# Altium integrated library OneBox.IntLib: 172 symbols (part 1 of 2) (continued)
## FUSB302BMPX (continued)

## FUSB340TMX
designator U?
Integrated Circuit; Manufacturer_Name: onsemi; Datasheet Link: https://componentsearchengine.com//FUSB340TMX.pdf; Height: 0.4mm; Mouser2 Part Number: 512-FUSB340TMX; Mouser2 Price/Stock: https://www.mouser.com/Search/Refine.aspx?Keyword=512-FUSB340TMX; Manufacturer_Part_Number: FUSB340TMX
footprint X2QFN-18
pins: 1 SSTXCOM-, 2 SSTXCOM+, 3 GND_1, 4 SSRXCOM-, 5 SSRXCOM+, 6 S, 7 ~{OE}, 8 SSRX2+, 9 SSRX2-, 10 SSRX1+, 11 SSRX1-, 12 GND_2, 13 SSTX2+, 14 SSTX2-, 15 SSTX1+, 16 SSTX1-, 17 VDD, 18 GND_3, 19 EP

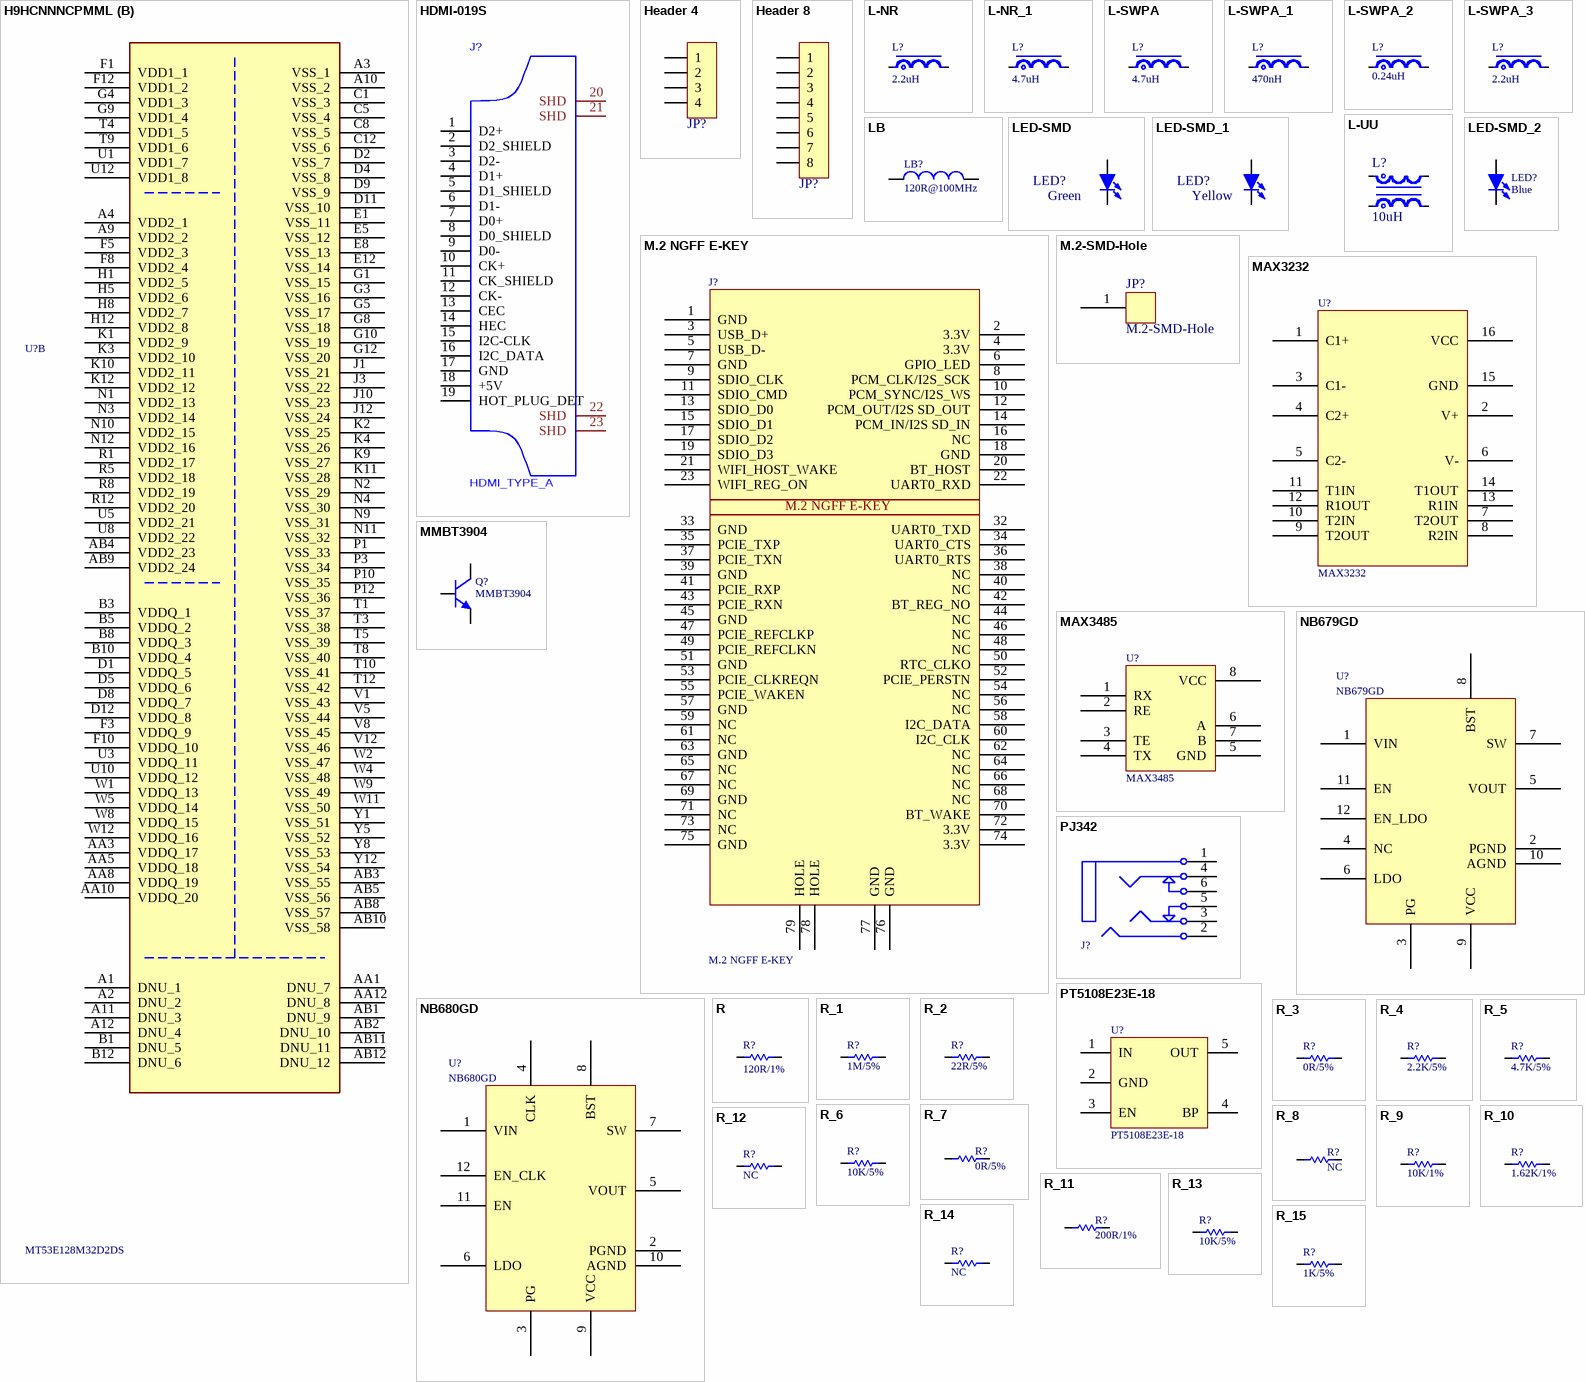
[diagram p2: symbols H9HCNNNCPMML to R_15]

## H9HCNNNCPMML
designator U?, comment MT53E128M32D2DS
LPDDR4 32Gbit 2GX16
footprint FBGA200_L15W10 (- Power By MH-KuBao!)
part A pins: A5 ZQ0, A8 ZQ1, AA2 DQ0_b, AA4 DQ7_b, AA9 DQ15_b, AA11 DQ8_b, B2 DQ0_a, B4 DQ7_a, B9 DQ15_a, B11 DQ8_a, C2 DQl_a, C3 DMI0_a, C4 DQ6_a, C9 DQ14_a, C10 DMIl_a, C11 DQ9_a, D3 DQS0_t_a, D10 DQS1_t_a, E2 DQ2_a, E3 DQS0_c_a, E4 DQ5_a, E9 DQ13_a, E10 DQS1_c_a, E11 DQ10_a, F2 DQ3_a, F4 DQ4_a, F9 DQ12_a, F11 DQ1l_a, G2 ODT_CA_a, G11 ZQ2_NC, H2 CA0_a, H3 CSl_a, H4 CS0_a, H9 CA2_a, H10 CA3_a, H11 CA4_a, J2 CAl_a, J4 CKE0_a, J5 CKEl_a, J8 CK_t_a, J9 CK_c_a, J11 CA5_a, K5 CS2_a_NC, K8 CKE2_a_NC, N5 CS2_b_NC, N8 CKE2_b_NC, P2 CA1_b, P4 CKE0_b, P5 CKE1_b, P8 CK_t_b, P9 CK_c_b, P11 CA5_b, R2 CA0_b, R3 CS1_b, R4 CS0_b, R9 CA2_b, R10 CA3_b, R11 CA4_b, T2 ODT_CA_b, T11 RESET_n, U2 DQ3_b, U4 DQ4_b, U9 DQ12_b, U11 DQ11_b, V2 DQ2_b, V3 DOS0_c_b, V4 DQ5_b, V9 DQ13_b, V10 DOSl_c_b, V11 DQ10_b, W3 DOS0_t_b, W10 DQS1_t_p, Y2 DQ1_b, Y3 DMI0_b, Y4 DQ6_b, Y9 DQ14_b, Y10 DMI1_b, Y11 DQ9_b
part B pins: A1 DNU_1, A2 DNU_2, A3 VSS_1, A4 VDD2_1, A9 VDD2_2, A10 VSS_2, A11 DNU_3, A12 DNU_4, AA1 DNU_7, AA3 VDDQ_17, AA5 VDDQ_18, AA8 VDDQ_19, AA10 VDDQ_20, AA12 DNU_8, AB1 DNU_9, AB2 DNU_10, AB3 VSS_55, AB4 VDD2_23, AB5 VSS_56, AB8 VSS_57, AB9 VDD2_24, AB10 VSS_58, AB11 DNU_11, AB12 DNU_12, B1 DNU_5, B3 VDDQ_1, B5 VDDQ_2, B8 VDDQ_3, B10 VDDQ_4, B12 DNU_6, C1 VSS_3, C5 VSS_4, C8 VSS_5, C12 VSS_6, D1 VDDQ_5, D2 VSS_7, D4 VSS_8, D5 VDDQ_6, D8 VDDQ_7, D9 VSS_9, D11 VSS_10, D12 VDDQ_8, E1 VSS_11, E5 VSS_12, E8 VSS_13, E12 VSS_14, F1 VDD1_1, F3 VDDQ_9, F5 VDD2_3, F8 VDD2_4, F10 VDDQ_10, F12 VDD1_2, G1 VSS_15, G3 VSS_16, G4 VDD1_3, G5 VSS_17, G8 VSS_18, G9 VDD1_4, G10 VSS_19, G12 VSS_20, H1 VDD2_5, H5 VDD2_6, H8 VDD2_7, H12 VDD2_8, J1 VSS_21, J3 VSS_22, J10 VSS_23, J12 VSS_24, K1 VDD2_9, K2 VSS_25, K3 VDD2_10, K4 VSS_26, K9 VSS_27, K10 VDD2_11, K11 VSS_28, K12 VDD2_12, N1 VDD2_13, N2 VSS_29, N3 VDD2_14, N4 VSS_30, N9 VSS_31, N10 VDD2_15, N11 VSS_32, N12 VDD2_16, P1 VSS_33, P3 VSS_34, P10 VSS_35, P12 VSS_36, R1 VDD2_17, R5 VDD2_18, R8 VDD2_19, R12 VDD2_20, T1 VSS_37, T3 VSS_38, T4 VDD1_5, T5 VSS_39, T8 VSS_40, T9 VDD1_6, T10 VSS_41, T12 VSS_42, U1 VDD1_7, U3 VDDQ_11, U5 VDD2_21, U8 VDD2_22, U10 VDDQ_12, U12 VDD1_8, V1 VSS_43, V5 VSS_44, V8 VSS_45, V12 VSS_46, W1 VDDQ_13, W2 VSS_47, W4 VSS_48, W5 VDDQ_14, W8 VDDQ_15, W9 VSS_49, W11 VSS_50, W12 VDDQ_16, Y1 VSS_51, Y5 VSS_52, Y8 VSS_53, Y12 VSS_54
part A text: CH_A; CH_B

## HDMI-019S
designator J?, comment HDMI_TYPE_A
footprint HDMI
pins: 1 D2+, 2 D2_SHIELD, 3 D2-, 4 D1+, 5 D1_SHIELD, 6 D1-, 7 D0+, 8 D0_SHIELD, 9 D0-, 10 CK+, 11 CK_SHIELD, 12 CK-, 13 CEC, 14 HEC, 15 I2C-CLK, 16 I2C_DATA, 17 GND, 18 +5V, 19 HOT_PLUG_DET, 20 SHD, 21 SHD, 22 SHD, 23 SHD

## Header 4
designator JP?, comment HDR-1X4  (value not drawn)
4P接插件; 版权归属: 源创客; BOM名称: 4P接插件; 学习资源: www.ooocke.com
footprint MX 1.25-LI-4P (长：6.75mm，宽：3.2mm，高：4.2mm)
footprint MX 1.25-LS-4P (长：9.75m，宽：3.7mm，高：4.7mm)
pins: 1, 2, 3, 4

## Header 8
designator JP?, comment HDR-1X8  (value not drawn)
8P接插件; 版权归属: 源创客; BOM名称: 8P接插件; 学习资源: www.ooocke.com
footprint MX 1.25-LS-8P (长：14.75m，宽：3.7mm，高：4.7mm)
pins: 1, 2, 3, 4, 5, 6, 7, 8

## L-NR
designator L?, comment 2.2uH
MPIA252012-2R2M 3A; BOM名称: NR磁胶电感
footprint NR2520 (2.5mm*2.0mm*1.0mm(长*宽*高）)
pins: 1, 2

## L-NR_1
designator L?, comment 4.7uH
4.7uH/3A,高2.0mm，WPN4020H4R7MT; BOM名称: NR磁胶电感
footprint NR2520 (2.5mm*2.0mm*1.0mm(长*宽*高）)
footprint NR4020 (4.0mm*4.0mm*2.0mm(长*宽*高）)
pins: 1, 2

## L-SWPA
designator L?, comment 4.7uH
电感-顺络_SWPA贴片屏蔽电感; BOM名称: 功率屏蔽电感
footprint SWPA252010 (轮廓2.5mm*2mm ，焊盘间距0.8mm)
footprint SWPA3015 (轮廓3mm*3mm ，焊盘间距1.5mm)
pins: 1, 2

## L-SWPA_1
designator L?, comment 470nH
DCR<50mohm 252010; BOM名称: 功率屏蔽电感
footprint SWPA252010 (轮廓2.5mm*2mm ，焊盘间距0.8mm)
pins: 1, 2

## L-SWPA_2
designator L?, comment 0.24uH
0.24uH/4A/WPN252012HR24MT; BOM名称: 功率屏蔽电感
footprint SWPA252010 (轮廓2.5mm*2mm ，焊盘间距0.8mm)
pins: 1, 2

## L-SWPA_3
designator L?, comment 2.2uH
电感-顺络_SWPA贴片屏蔽电感; BOM名称: 功率屏蔽电感
footprint SWPA252010 (轮廓2.5mm*2mm ，焊盘间距0.8mm)
footprint SWPA3015 (轮廓3mm*3mm ，焊盘间距1.5mm)
pins: 1, 2

## L-UU
designator L?, comment 10uH
电感-共模电感; BOM名称: 共模电感
footprint RP2_0405
footprint SDMM0806
pins: 1, 2, 3, 4

## LB
designator LB?, comment 120R@100MHz
磁珠 2A L0402; 版权归属: 源创客; BOM名称: 磁珠; 学习资源: www.ooocke.com
footprint FB 0402_L (小功率贴片磁珠)
footprint FB 0603_L (小功率贴片磁珠)
footprint FB 0805_L (小功率贴片磁珠)
footprint FB 1206_L (小功率贴片磁珠)
pins: 1, 2

## LED-SMD
designator LED?, comment Green
贴片LED; 版权归属: 源创客; BOM名称: 贴片LED; 学习资源: www.ooocke.com
footprint LED 0603B (蓝色0603LED)
footprint LED 0603G (绿色0603LED)
footprint LED 0603R (红色0603LED)
footprint LED 0603W (白色0603LED)
footprint LED 0603Y (黄色0603LED)
pins: 1 A, 2 K

## LED-SMD_1
designator LED?, comment Yellow
贴片LED; 版权归属: 源创客; BOM名称: 贴片LED; 学习资源: www.ooocke.com
footprint LED 0603B (蓝色0603LED)
footprint LED 0603G (绿色0603LED)
footprint LED 0603R (红色0603LED)
footprint LED 0603W (白色0603LED)
footprint LED 0603Y (黄色0603LED)
pins: 1 A, 2 K

## LED-SMD_2
designator LED?, comment Blue
贴片LED; 版权归属: 源创客; BOM名称: 贴片LED; 学习资源: www.ooocke.com
footprint LED 0603B (蓝色0603LED)
footprint LED 0603G (绿色0603LED)
footprint LED 0603R (红色0603LED)
footprint LED 0603W (白色0603LED)
footprint LED 0603Y (黄色0603LED)
pins: 1 A, 2 K

## M.2 NGFF E-KEY
designator J?
Connector; Manufacturer_Name: TE Connectivity; Manufacturer_Part_Number: 2199230-4; Datasheet Link: https://componentsearchengine.com//2199230-4.pdf; Mouser2 Part Number: 571-2199230-4; Mouser2 Price/Stock: https://www.mouser.com/Search/Refine.aspx?Keyword=571-2199230-4
footprint M.2 NGFF E-KEY
pins: 1 GND, 2 3.3V, 3 USB_D+, 4 3.3V, 5 USB_D-, 6 GPIO_LED, 7 GND, 8 PCM_CLK/I2S_SCK, 9 SDIO_CLK, 10 PCM_SYNC/I2S_WS, 11 SDIO_CMD, 12 PCM_OUT/I2S SD_OUT, 13 SDIO_D0, 14 PCM_IN/I2S SD_IN, 15 SDIO_D1, 16 NC, 17 SDIO_D2, 18 GND, 19 SDIO_D3, 20 BT_HOST, 21 WIFI_HOST_WAKE, 22 UART0_RXD, 23 WIFI_REG_ON, 32 UART0_TXD, 33 GND, 34 UART0_CTS, 35 PCIE_TXP, 36 UART0_RTS, 37 PCIE_TXN, 38 NC, 39 GND, 40 NC, 41 PCIE_RXP, 42 BT_REG_NO, 43 PCIE_RXN, 44 NC, 45 GND, 46 NC, 47 PCIE_REFCLKP, 48 NC, 49 PCIE_REFCLKN, 50 RTC_CLKO, 51 GND, 52 PCIE_PERSTN, 53 PCIE_CLKREQN, 54 NC, 55 PCIE_WAKEN, 56 NC, 57 GND, 58 I2C_DATA, 59 NC, 60 I2C_CLK, 61 NC, 62 NC, 63 GND, 64 NC, 65 NC, 66 NC, 67 NC, 68 NC, 69 GND, 70 BT_WAKE, 71 NC, 72 3.3V, 73 NC, 74 3.3V, 75 GND, 76 GND, 77 GND, 78 HOLE, 79 HOLE

## M.2-SMD-Hole
designator JP?
footprint M.2 SMT HOLE
footprint SMT-HOLE-M2*3.5*3.5+1.2
pins: 1

## MAX3232
designator U?
footprint SOP16_L (10.3*6.2*1.8mm（长宽高）)
pins: 1 C1+, 2 V+, 3 C1-, 4 C2+, 5 C2-, 6 V-, 7 T2OUT, 8 R2IN, 9 T2OUT, 10 T2IN, 11 T1IN, 12 R1OUT, 13 R1IN, 14 T1OUT, 15 GND, 16 VCC

## MAX3485
designator U?
footprint SOP8_L (4*5*1.8mm（长宽高）)
pins: 1 RX, 2 RE, 3 TE, 4 TX, 5 GND, 6 A, 7 B, 8 VCC

## MMBT3904
designator Q?
高频放大-NPN型; 参数: 40V 0.2A 0.3W 300MHZ; BOM名称: 高频放大-NPN型
footprint SOT723
pins: 1 B, 2 E, 3 C

## NB679GD
designator U?
footprint QFN-12 (2mm * 3mm)
pins: 1 VIN, 2 PGND, 3 PG, 4 NC, 5 VOUT, 6 LDO, 7 SW, 8 BST, 9 VCC, 10 AGND, 11 EN, 12 EN_LDO

## NB680GD
designator U?
footprint QFN-12 (2mm * 3mm)
pins: 1 VIN, 2 PGND, 3 PG, 4 CLK, 5 VOUT, 6 LDO, 7 SW, 8 BST, 9 VCC, 10 AGND, 11 EN, 12 EN_CLK

## PJ342
designator J?  (value not drawn)
3.5耳机插座,4Pin; BOM名称: 耳机插座; 版权归属: 源创客; 学习资源: www.ooocke.com
footprint PJ342A (有头)
pins: 1, 2, 3, 4, 5, 6

## PT5108E23E-18
designator U?
LDO 降压芯片; BOM名称: 可调升压芯片; 版权归属: 源创客; 学习资源: www.ooocke.com
footprint SOT23-5M (3x1.6x1.1mm(长宽高))
footprint SOT23-5N (3x1.6x1.1mm(长宽高))
pins: 1 IN, 2 GND, 3 EN, 4 BP, 5 OUT

## R
designator R?, comment 120R/1%
1% R0201; BOM名称: 贴片电阻
footprint R0201_M (1/20W贴片电阻)
footprint R0201_NS (1/20W贴片电阻-无丝印)
footprint R0402_M (1/16W贴片电阻)
footprint R0402_NS (1/16W贴片电阻-无丝印)
footprint R0603_M (1/10W贴片电阻)
footprint R0603_NS (1/10W贴片电阻-无丝印)
footprint R0805_NS (1/8W贴片电阻-无丝印)
footprint R0805_M (1/8W贴片电阻)
footprint R01005_NS (1/32W贴片电阻-无丝印)
footprint R1206_M (1/4W贴片电阻)
footprint R1210_M (1/3W贴片电阻)
footprint R1206_NS (1/4W贴片电阻-无丝印)
footprint R1210_NS (1/3W贴片电阻)
footprint R1812_M (1/2W贴片电阻)
footprint R2010_M (3/4W贴片电阻)
footprint R2512_M (1W贴片电阻)
pins: 1, 2

## R_1
designator R?, comment 1M/5%
5% R0201; BOM名称: 贴片电阻
footprint R0201_M (1/20W贴片电阻)
footprint R0201_NS (1/20W贴片电阻-无丝印)
footprint R0402_M (1/16W贴片电阻)
footprint R0402_NS (1/16W贴片电阻-无丝印)
footprint R0603_M (1/10W贴片电阻)
footprint R0603_NS (1/10W贴片电阻-无丝印)
footprint R0805_NS (1/8W贴片电阻-无丝印)
footprint R0805_M (1/8W贴片电阻)
footprint R01005_NS (1/32W贴片电阻-无丝印)
footprint R1206_M (1/4W贴片电阻)
footprint R1210_M (1/3W贴片电阻)
footprint R1206_NS (1/4W贴片电阻-无丝印)
footprint R1210_NS (1/3W贴片电阻)
footprint R1812_M (1/2W贴片电阻)
footprint R2010_M (3/4W贴片电阻)
footprint R2512_M (1W贴片电阻)
pins: 1, 2

## R_2
designator R?, comment 22R/5%
5% R0201; BOM名称: 贴片电阻
footprint R0201_M (1/20W贴片电阻)
footprint R0201_NS (1/20W贴片电阻-无丝印)
footprint R0402_M (1/16W贴片电阻)
footprint R0402_NS (1/16W贴片电阻-无丝印)
footprint R0603_M (1/10W贴片电阻)
footprint R0603_NS (1/10W贴片电阻-无丝印)
footprint R0805_NS (1/8W贴片电阻-无丝印)
footprint R0805_M (1/8W贴片电阻)
footprint R01005_NS (1/32W贴片电阻-无丝印)
footprint R1206_M (1/4W贴片电阻)
footprint R1210_M (1/3W贴片电阻)
footprint R1206_NS (1/4W贴片电阻-无丝印)
footprint R1210_NS (1/3W贴片电阻)
footprint R1812_M (1/2W贴片电阻)
footprint R2010_M (3/4W贴片电阻)
footprint R2512_M (1W贴片电阻)
pins: 1, 2

## R_3
designator R?, comment 0R/5%
5% R0201; BOM名称: 贴片电阻
footprint R0201_M (1/20W贴片电阻)
footprint R0201_NS (1/20W贴片电阻-无丝印)
footprint R0402_M (1/16W贴片电阻)
footprint R0402_NS (1/16W贴片电阻-无丝印)
footprint R0603_M (1/10W贴片电阻)
footprint R0603_NS (1/10W贴片电阻-无丝印)
footprint R0805_NS (1/8W贴片电阻-无丝印)
footprint R0805_M (1/8W贴片电阻)
footprint R01005_NS (1/32W贴片电阻-无丝印)
footprint R1206_M (1/4W贴片电阻)
footprint R1210_M (1/3W贴片电阻)
footprint R1206_NS (1/4W贴片电阻-无丝印)
footprint R1210_NS (1/3W贴片电阻)
footprint R1812_M (1/2W贴片电阻)
footprint R2010_M (3/4W贴片电阻)
footprint R2512_M (1W贴片电阻)
pins: 1, 2

## R_4
designator R?, comment 2.2K/5%
5% R0201; BOM名称: 贴片电阻
footprint R0201_M (1/20W贴片电阻)
footprint R0201_NS (1/20W贴片电阻-无丝印)
footprint R0402_M (1/16W贴片电阻)
footprint R0402_NS (1/16W贴片电阻-无丝印)
footprint R0603_M (1/10W贴片电阻)
footprint R0603_NS (1/10W贴片电阻-无丝印)
footprint R0805_NS (1/8W贴片电阻-无丝印)
footprint R0805_M (1/8W贴片电阻)
footprint R01005_NS (1/32W贴片电阻-无丝印)
footprint R1206_M (1/4W贴片电阻)
footprint R1210_M (1/3W贴片电阻)
footprint R1206_NS (1/4W贴片电阻-无丝印)
footprint R1210_NS (1/3W贴片电阻)
footprint R1812_M (1/2W贴片电阻)
footprint R2010_M (3/4W贴片电阻)
footprint R2512_M (1W贴片电阻)
pins: 1, 2

## R_5
designator R?, comment 4.7K/5%
5% R0201; BOM名称: 贴片电阻
footprint R0201_M (1/20W贴片电阻)
footprint R0201_NS (1/20W贴片电阻-无丝印)
footprint R0402_M (1/16W贴片电阻)
footprint R0402_NS (1/16W贴片电阻-无丝印)
footprint R0603_M (1/10W贴片电阻)
footprint R0603_NS (1/10W贴片电阻-无丝印)
footprint R0805_NS (1/8W贴片电阻-无丝印)
footprint R0805_M (1/8W贴片电阻)
footprint R01005_NS (1/32W贴片电阻-无丝印)
footprint R1206_M (1/4W贴片电阻)
footprint R1210_M (1/3W贴片电阻)
footprint R1206_NS (1/4W贴片电阻-无丝印)
footprint R1210_NS (1/3W贴片电阻)
footprint R1812_M (1/2W贴片电阻)
footprint R2010_M (3/4W贴片电阻)
footprint R2512_M (1W贴片电阻)
pins: 1, 2

## R_6
designator R?, comment 10K/5%
5% R0201; BOM名称: 贴片电阻
footprint R0201_M (1/20W贴片电阻)
footprint R0201_NS (1/20W贴片电阻-无丝印)
footprint R0402_M (1/16W贴片电阻)
footprint R0402_NS (1/16W贴片电阻-无丝印)
footprint R0603_M (1/10W贴片电阻)
footprint R0603_NS (1/10W贴片电阻-无丝印)
footprint R0805_NS (1/8W贴片电阻-无丝印)
footprint R0805_M (1/8W贴片电阻)
footprint R01005_NS (1/32W贴片电阻-无丝印)
footprint R1206_M (1/4W贴片电阻)
footprint R1210_M (1/3W贴片电阻)
footprint R1206_NS (1/4W贴片电阻-无丝印)
footprint R1210_NS (1/3W贴片电阻)
footprint R1812_M (1/2W贴片电阻)
footprint R2010_M (3/4W贴片电阻)
footprint R2512_M (1W贴片电阻)
pins: 1, 2

## R_7
designator R?, comment 0R/5%
5% R0402; BOM名称: 贴片电阻
footprint R0201_M (1/20W贴片电阻)
footprint R0201_NS (1/20W贴片电阻-无丝印)
footprint R0402_M (1/16W贴片电阻)
footprint R0402_NS (1/16W贴片电阻-无丝印)
footprint R0603_M (1/10W贴片电阻)
footprint R0603_NS (1/10W贴片电阻-无丝印)
footprint R0805_NS (1/8W贴片电阻-无丝印)
footprint R0805_M (1/8W贴片电阻)
footprint R01005_NS (1/32W贴片电阻-无丝印)
footprint R1206_M (1/4W贴片电阻)
footprint R1210_M (1/3W贴片电阻)
footprint R1206_NS (1/4W贴片电阻-无丝印)
footprint R1210_NS (1/3W贴片电阻)
footprint R1812_M (1/2W贴片电阻)
footprint R2010_M (3/4W贴片电阻)
footprint R2512_M (1W贴片电阻)
pins: 1, 2

## R_8
designator R?, comment NC
5% R0402; BOM名称: 贴片电阻
footprint R0201_M (1/20W贴片电阻)
footprint R0201_NS (1/20W贴片电阻-无丝印)
footprint R0402_M (1/16W贴片电阻)
footprint R0402_NS (1/16W贴片电阻-无丝印)
footprint R0603_M (1/10W贴片电阻)
footprint R0603_NS (1/10W贴片电阻-无丝印)
footprint R0805_NS (1/8W贴片电阻-无丝印)
footprint R0805_M (1/8W贴片电阻)
footprint R01005_NS (1/32W贴片电阻-无丝印)
footprint R1206_M (1/4W贴片电阻)
footprint R1210_M (1/3W贴片电阻)
footprint R1206_NS (1/4W贴片电阻-无丝印)
footprint R1210_NS (1/3W贴片电阻)
footprint R1812_M (1/2W贴片电阻)
footprint R2010_M (3/4W贴片电阻)
footprint R2512_M (1W贴片电阻)
pins: 1, 2

## R_9
designator R?, comment 10K/1%
1% R0201; BOM名称: 贴片电阻
footprint R0201_M (1/20W贴片电阻)
footprint R0201_NS (1/20W贴片电阻-无丝印)
footprint R0402_M (1/16W贴片电阻)
footprint R0402_NS (1/16W贴片电阻-无丝印)
footprint R0603_M (1/10W贴片电阻)
footprint R0603_NS (1/10W贴片电阻-无丝印)
footprint R0805_NS (1/8W贴片电阻-无丝印)
footprint R0805_M (1/8W贴片电阻)
footprint R01005_NS (1/32W贴片电阻-无丝印)
footprint R1206_M (1/4W贴片电阻)
footprint R1210_M (1/3W贴片电阻)
footprint R1206_NS (1/4W贴片电阻-无丝印)
footprint R1210_NS (1/3W贴片电阻)
footprint R1812_M (1/2W贴片电阻)
footprint R2010_M (3/4W贴片电阻)
footprint R2512_M (1W贴片电阻)
pins: 1, 2

## R_10
designator R?, comment 1.62K/1%
1% R0201; BOM名称: 贴片电阻
footprint R0201_M (1/20W贴片电阻)
footprint R0201_NS (1/20W贴片电阻-无丝印)
footprint R0402_M (1/16W贴片电阻)
footprint R0402_NS (1/16W贴片电阻-无丝印)
footprint R0603_M (1/10W贴片电阻)
footprint R0603_NS (1/10W贴片电阻-无丝印)
footprint R0805_NS (1/8W贴片电阻-无丝印)
footprint R0805_M (1/8W贴片电阻)
footprint R01005_NS (1/32W贴片电阻-无丝印)
footprint R1206_M (1/4W贴片电阻)
footprint R1210_M (1/3W贴片电阻)
footprint R1206_NS (1/4W贴片电阻-无丝印)
footprint R1210_NS (1/3W贴片电阻)
footprint R1812_M (1/2W贴片电阻)
footprint R2010_M (3/4W贴片电阻)
footprint R2512_M (1W贴片电阻)
pins: 1, 2

## R_11
designator R?, comment 200R/1%
1% R0201; BOM名称: 贴片电阻
footprint R0201_M (1/20W贴片电阻)
footprint R0201_NS (1/20W贴片电阻-无丝印)
footprint R0402_M (1/16W贴片电阻)
footprint R0402_NS (1/16W贴片电阻-无丝印)
footprint R0603_M (1/10W贴片电阻)
footprint R0603_NS (1/10W贴片电阻-无丝印)
footprint R0805_NS (1/8W贴片电阻-无丝印)
footprint R0805_M (1/8W贴片电阻)
footprint R01005_NS (1/32W贴片电阻-无丝印)
footprint R1206_M (1/4W贴片电阻)
footprint R1210_M (1/3W贴片电阻)
footprint R1206_NS (1/4W贴片电阻-无丝印)
footprint R1210_NS (1/3W贴片电阻)
footprint R1812_M (1/2W贴片电阻)
footprint R2010_M (3/4W贴片电阻)
footprint R2512_M (1W贴片电阻)
pins: 1, 2

## R_12
designator R?, comment NC
5% R0201; BOM名称: 贴片电阻
footprint R0201_M (1/20W贴片电阻)
footprint R0201_NS (1/20W贴片电阻-无丝印)
footprint R0402_M (1/16W贴片电阻)
footprint R0402_NS (1/16W贴片电阻-无丝印)
footprint R0603_M (1/10W贴片电阻)
footprint R0603_NS (1/10W贴片电阻-无丝印)
footprint R0805_NS (1/8W贴片电阻-无丝印)
footprint R0805_M (1/8W贴片电阻)
footprint R01005_NS (1/32W贴片电阻-无丝印)
footprint R1206_M (1/4W贴片电阻)
footprint R1210_M (1/3W贴片电阻)
footprint R1206_NS (1/4W贴片电阻-无丝印)
footprint R1210_NS (1/3W贴片电阻)
footprint R1812_M (1/2W贴片电阻)
footprint R2010_M (3/4W贴片电阻)
footprint R2512_M (1W贴片电阻)
pins: 1, 2

## R_13
designator R?, comment 10K/5%
5% R0402; BOM名称: 贴片电阻
footprint R0201_M (1/20W贴片电阻)
footprint R0201_NS (1/20W贴片电阻-无丝印)
footprint R0402_M (1/16W贴片电阻)
footprint R0402_NS (1/16W贴片电阻-无丝印)
footprint R0603_M (1/10W贴片电阻)
footprint R0603_NS (1/10W贴片电阻-无丝印)
footprint R0805_NS (1/8W贴片电阻-无丝印)
footprint R0805_M (1/8W贴片电阻)
footprint R01005_NS (1/32W贴片电阻-无丝印)
footprint R1206_M (1/4W贴片电阻)
footprint R1210_M (1/3W贴片电阻)
footprint R1206_NS (1/4W贴片电阻-无丝印)
footprint R1210_NS (1/3W贴片电阻)
footprint R1812_M (1/2W贴片电阻)
footprint R2010_M (3/4W贴片电阻)
footprint R2512_M (1W贴片电阻)
pins: 1, 2

## R_14
designator R?, comment NC
5% R0402 47K; BOM名称: 贴片电阻
footprint R0201_M (1/20W贴片电阻)
footprint R0201_NS (1/20W贴片电阻-无丝印)
footprint R0402_M (1/16W贴片电阻)
footprint R0402_NS (1/16W贴片电阻-无丝印)
footprint R0603_M (1/10W贴片电阻)
footprint R0603_NS (1/10W贴片电阻-无丝印)
footprint R0805_NS (1/8W贴片电阻-无丝印)
footprint R0805_M (1/8W贴片电阻)
footprint R01005_NS (1/32W贴片电阻-无丝印)
footprint R1206_M (1/4W贴片电阻)
footprint R1210_M (1/3W贴片电阻)
footprint R1206_NS (1/4W贴片电阻-无丝印)
footprint R1210_NS (1/3W贴片电阻)
footprint R1812_M (1/2W贴片电阻)
footprint R2010_M (3/4W贴片电阻)
footprint R2512_M (1W贴片电阻)
pins: 1, 2

## R_15
designator R?, comment 1K/5%
5% R0201; BOM名称: 贴片电阻
footprint R0201_M (1/20W贴片电阻)
footprint R0201_NS (1/20W贴片电阻-无丝印)
footprint R0402_M (1/16W贴片电阻)
footprint R0402_NS (1/16W贴片电阻-无丝印)
footprint R0603_M (1/10W贴片电阻)
footprint R0603_NS (1/10W贴片电阻-无丝印)
footprint R0805_NS (1/8W贴片电阻-无丝印)
footprint R0805_M (1/8W贴片电阻)
footprint R01005_NS (1/32W贴片电阻-无丝印)
footprint R1206_M (1/4W贴片电阻)
footprint R1210_M (1/3W贴片电阻)
footprint R1206_NS (1/4W贴片电阻-无丝印)
footprint R1210_NS (1/3W贴片电阻)
footprint R1812_M (1/2W贴片电阻)
footprint R2010_M (3/4W贴片电阻)
footprint R2512_M (1W贴片电阻)
pins: 1, 2

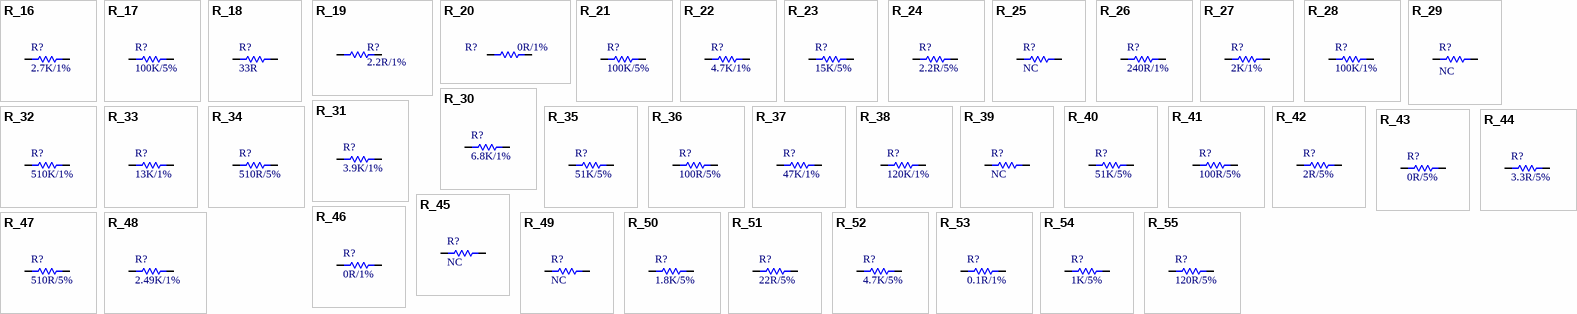
[diagram p3: symbols R_16 to R_55]

## R_16
designator R?, comment 2.7K/1%
1% R0201; BOM名称: 贴片电阻
footprint R0201_M (1/20W贴片电阻)
footprint R0201_NS (1/20W贴片电阻-无丝印)
footprint R0402_M (1/16W贴片电阻)
footprint R0402_NS (1/16W贴片电阻-无丝印)
footprint R0603_M (1/10W贴片电阻)
footprint R0603_NS (1/10W贴片电阻-无丝印)
footprint R0805_NS (1/8W贴片电阻-无丝印)
footprint R0805_M (1/8W贴片电阻)
footprint R01005_NS (1/32W贴片电阻-无丝印)
footprint R1206_M (1/4W贴片电阻)
footprint R1210_M (1/3W贴片电阻)
footprint R1206_NS (1/4W贴片电阻-无丝印)
footprint R1210_NS (1/3W贴片电阻)
footprint R1812_M (1/2W贴片电阻)
footprint R2010_M (3/4W贴片电阻)
footprint R2512_M (1W贴片电阻)
pins: 1, 2

## R_17
designator R?, comment 100K/5%
5% R0201; BOM名称: 贴片电阻
footprint R0201_M (1/20W贴片电阻)
footprint R0201_NS (1/20W贴片电阻-无丝印)
footprint R0402_M (1/16W贴片电阻)
footprint R0402_NS (1/16W贴片电阻-无丝印)
footprint R0603_M (1/10W贴片电阻)
footprint R0603_NS (1/10W贴片电阻-无丝印)
footprint R0805_NS (1/8W贴片电阻-无丝印)
footprint R0805_M (1/8W贴片电阻)
footprint R01005_NS (1/32W贴片电阻-无丝印)
footprint R1206_M (1/4W贴片电阻)
footprint R1210_M (1/3W贴片电阻)
footprint R1206_NS (1/4W贴片电阻-无丝印)
footprint R1210_NS (1/3W贴片电阻)
footprint R1812_M (1/2W贴片电阻)
footprint R2010_M (3/4W贴片电阻)
footprint R2512_M (1W贴片电阻)
pins: 1, 2

## R_18
designator R?, comment 33R
5% R0201; BOM名称: 贴片电阻
footprint R0201_M (1/20W贴片电阻)
footprint R0201_NS (1/20W贴片电阻-无丝印)
footprint R0402_M (1/16W贴片电阻)
footprint R0402_NS (1/16W贴片电阻-无丝印)
footprint R0603_M (1/10W贴片电阻)
footprint R0603_NS (1/10W贴片电阻-无丝印)
footprint R0805_NS (1/8W贴片电阻-无丝印)
footprint R0805_M (1/8W贴片电阻)
footprint R01005_NS (1/32W贴片电阻-无丝印)
footprint R1206_M (1/4W贴片电阻)
footprint R1210_M (1/3W贴片电阻)
footprint R1206_NS (1/4W贴片电阻-无丝印)
footprint R1210_NS (1/3W贴片电阻)
footprint R1812_M (1/2W贴片电阻)
footprint R2010_M (3/4W贴片电阻)
footprint R2512_M (1W贴片电阻)
pins: 1, 2

## R_19
designator R?, comment 2.2R/1%
1% R0201; BOM名称: 贴片电阻
footprint R0201_M (1/20W贴片电阻)
footprint R0201_NS (1/20W贴片电阻-无丝印)
footprint R0402_M (1/16W贴片电阻)
footprint R0402_NS (1/16W贴片电阻-无丝印)
footprint R0603_M (1/10W贴片电阻)
footprint R0603_NS (1/10W贴片电阻-无丝印)
footprint R0805_NS (1/8W贴片电阻-无丝印)
footprint R0805_M (1/8W贴片电阻)
footprint R01005_NS (1/32W贴片电阻-无丝印)
footprint R1206_M (1/4W贴片电阻)
footprint R1210_M (1/3W贴片电阻)
footprint R1206_NS (1/4W贴片电阻-无丝印)
footprint R1210_NS (1/3W贴片电阻)
footprint R1812_M (1/2W贴片电阻)
footprint R2010_M (3/4W贴片电阻)
footprint R2512_M (1W贴片电阻)
pins: 1, 2

## R_20
designator R?, comment 0R/1%
1% R0201; BOM名称: 贴片电阻
footprint R0201_M (1/20W贴片电阻)
footprint R0201_NS (1/20W贴片电阻-无丝印)
footprint R0402_M (1/16W贴片电阻)
footprint R0402_NS (1/16W贴片电阻-无丝印)
footprint R0603_M (1/10W贴片电阻)
footprint R0603_NS (1/10W贴片电阻-无丝印)
footprint R0805_NS (1/8W贴片电阻-无丝印)
footprint R0805_M (1/8W贴片电阻)
footprint R01005_NS (1/32W贴片电阻-无丝印)
footprint R1206_M (1/4W贴片电阻)
footprint R1210_M (1/3W贴片电阻)
footprint R1206_NS (1/4W贴片电阻-无丝印)
footprint R1210_NS (1/3W贴片电阻)
footprint R1812_M (1/2W贴片电阻)
footprint R2010_M (3/4W贴片电阻)
footprint R2512_M (1W贴片电阻)
pins: 1, 2

## R_21
designator R?, comment 100K/5%
5% R0402; BOM名称: 贴片电阻
footprint R0201_M (1/20W贴片电阻)
footprint R0201_NS (1/20W贴片电阻-无丝印)
footprint R0402_M (1/16W贴片电阻)
footprint R0402_NS (1/16W贴片电阻-无丝印)
footprint R0603_M (1/10W贴片电阻)
footprint R0603_NS (1/10W贴片电阻-无丝印)
footprint R0805_NS (1/8W贴片电阻-无丝印)
footprint R0805_M (1/8W贴片电阻)
footprint R01005_NS (1/32W贴片电阻-无丝印)
footprint R1206_M (1/4W贴片电阻)
footprint R1210_M (1/3W贴片电阻)
footprint R1206_NS (1/4W贴片电阻-无丝印)
footprint R1210_NS (1/3W贴片电阻)
footprint R1812_M (1/2W贴片电阻)
footprint R2010_M (3/4W贴片电阻)
footprint R2512_M (1W贴片电阻)
pins: 1, 2

## R_22
designator R?, comment 4.7K/1%
1% R0402; BOM名称: 贴片电阻
footprint R0201_M (1/20W贴片电阻)
footprint R0201_NS (1/20W贴片电阻-无丝印)
footprint R0402_M (1/16W贴片电阻)
footprint R0402_NS (1/16W贴片电阻-无丝印)
footprint R0603_M (1/10W贴片电阻)
footprint R0603_NS (1/10W贴片电阻-无丝印)
footprint R0805_NS (1/8W贴片电阻-无丝印)
footprint R0805_M (1/8W贴片电阻)
footprint R01005_NS (1/32W贴片电阻-无丝印)
footprint R1206_M (1/4W贴片电阻)
footprint R1210_M (1/3W贴片电阻)
footprint R1206_NS (1/4W贴片电阻-无丝印)
footprint R1210_NS (1/3W贴片电阻)
footprint R1812_M (1/2W贴片电阻)
footprint R2010_M (3/4W贴片电阻)
footprint R2512_M (1W贴片电阻)
pins: 1, 2

## R_23
designator R?, comment 15K/5%
5% R0402; BOM名称: 贴片电阻
footprint R0201_M (1/20W贴片电阻)
footprint R0201_NS (1/20W贴片电阻-无丝印)
footprint R0402_M (1/16W贴片电阻)
footprint R0402_NS (1/16W贴片电阻-无丝印)
footprint R0603_M (1/10W贴片电阻)
footprint R0603_NS (1/10W贴片电阻-无丝印)
footprint R0805_NS (1/8W贴片电阻-无丝印)
footprint R0805_M (1/8W贴片电阻)
footprint R01005_NS (1/32W贴片电阻-无丝印)
footprint R1206_M (1/4W贴片电阻)
footprint R1210_M (1/3W贴片电阻)
footprint R1206_NS (1/4W贴片电阻-无丝印)
footprint R1210_NS (1/3W贴片电阻)
footprint R1812_M (1/2W贴片电阻)
footprint R2010_M (3/4W贴片电阻)
footprint R2512_M (1W贴片电阻)
pins: 1, 2

## R_24
designator R?, comment 2.2R/5%
5% R0201; BOM名称: 贴片电阻
footprint R0201_M (1/20W贴片电阻)
footprint R0201_NS (1/20W贴片电阻-无丝印)
footprint R0402_M (1/16W贴片电阻)
footprint R0402_NS (1/16W贴片电阻-无丝印)
footprint R0603_M (1/10W贴片电阻)
footprint R0603_NS (1/10W贴片电阻-无丝印)
footprint R0805_NS (1/8W贴片电阻-无丝印)
footprint R0805_M (1/8W贴片电阻)
footprint R01005_NS (1/32W贴片电阻-无丝印)
footprint R1206_M (1/4W贴片电阻)
footprint R1210_M (1/3W贴片电阻)
footprint R1206_NS (1/4W贴片电阻-无丝印)
footprint R1210_NS (1/3W贴片电阻)
footprint R1812_M (1/2W贴片电阻)
footprint R2010_M (3/4W贴片电阻)
footprint R2512_M (1W贴片电阻)
pins: 1, 2

## R_25
designator R?, comment NC
5% R0402 10K; BOM名称: 贴片电阻
footprint R0201_M (1/20W贴片电阻)
footprint R0201_NS (1/20W贴片电阻-无丝印)
footprint R0402_M (1/16W贴片电阻)
footprint R0402_NS (1/16W贴片电阻-无丝印)
footprint R0603_M (1/10W贴片电阻)
footprint R0603_NS (1/10W贴片电阻-无丝印)
footprint R0805_NS (1/8W贴片电阻-无丝印)
footprint R0805_M (1/8W贴片电阻)
footprint R01005_NS (1/32W贴片电阻-无丝印)
footprint R1206_M (1/4W贴片电阻)
footprint R1210_M (1/3W贴片电阻)
footprint R1206_NS (1/4W贴片电阻-无丝印)
footprint R1210_NS (1/3W贴片电阻)
footprint R1812_M (1/2W贴片电阻)
footprint R2010_M (3/4W贴片电阻)
footprint R2512_M (1W贴片电阻)
pins: 1, 2

## R_26
designator R?, comment 240R/1%
1% R0201; BOM名称: 贴片电阻
footprint R0201_M (1/20W贴片电阻)
footprint R0201_NS (1/20W贴片电阻-无丝印)
footprint R0402_M (1/16W贴片电阻)
footprint R0402_NS (1/16W贴片电阻-无丝印)
footprint R0603_M (1/10W贴片电阻)
footprint R0603_NS (1/10W贴片电阻-无丝印)
footprint R0805_NS (1/8W贴片电阻-无丝印)
footprint R0805_M (1/8W贴片电阻)
footprint R01005_NS (1/32W贴片电阻-无丝印)
footprint R1206_M (1/4W贴片电阻)
footprint R1210_M (1/3W贴片电阻)
footprint R1206_NS (1/4W贴片电阻-无丝印)
footprint R1210_NS (1/3W贴片电阻)
footprint R1812_M (1/2W贴片电阻)
footprint R2010_M (3/4W贴片电阻)
footprint R2512_M (1W贴片电阻)
pins: 1, 2

## R_27
designator R?, comment 2K/1%
1% R0201; BOM名称: 贴片电阻
footprint R0201_M (1/20W贴片电阻)
footprint R0201_NS (1/20W贴片电阻-无丝印)
footprint R0402_M (1/16W贴片电阻)
footprint R0402_NS (1/16W贴片电阻-无丝印)
footprint R0603_M (1/10W贴片电阻)
footprint R0603_NS (1/10W贴片电阻-无丝印)
footprint R0805_NS (1/8W贴片电阻-无丝印)
footprint R0805_M (1/8W贴片电阻)
footprint R01005_NS (1/32W贴片电阻-无丝印)
footprint R1206_M (1/4W贴片电阻)
footprint R1210_M (1/3W贴片电阻)
footprint R1206_NS (1/4W贴片电阻-无丝印)
footprint R1210_NS (1/3W贴片电阻)
footprint R1812_M (1/2W贴片电阻)
footprint R2010_M (3/4W贴片电阻)
footprint R2512_M (1W贴片电阻)
pins: 1, 2

## R_28
designator R?, comment 100K/1%
1% R0201; BOM名称: 贴片电阻
footprint R0201_M (1/20W贴片电阻)
footprint R0201_NS (1/20W贴片电阻-无丝印)
footprint R0402_M (1/16W贴片电阻)
footprint R0402_NS (1/16W贴片电阻-无丝印)
footprint R0603_M (1/10W贴片电阻)
footprint R0603_NS (1/10W贴片电阻-无丝印)
footprint R0805_NS (1/8W贴片电阻-无丝印)
footprint R0805_M (1/8W贴片电阻)
footprint R01005_NS (1/32W贴片电阻-无丝印)
footprint R1206_M (1/4W贴片电阻)
footprint R1210_M (1/3W贴片电阻)
footprint R1206_NS (1/4W贴片电阻-无丝印)
footprint R1210_NS (1/3W贴片电阻)
footprint R1812_M (1/2W贴片电阻)
footprint R2010_M (3/4W贴片电阻)
footprint R2512_M (1W贴片电阻)
pins: 1, 2

## R_29
designator R?, comment NC
5% R0603 0R; BOM名称: 贴片电阻
footprint R0201_M (1/20W贴片电阻)
footprint R0201_NS (1/20W贴片电阻-无丝印)
footprint R0402_M (1/16W贴片电阻)
footprint R0402_NS (1/16W贴片电阻-无丝印)
footprint R0603_M (1/10W贴片电阻)
footprint R0603_NS (1/10W贴片电阻-无丝印)
footprint R0805_NS (1/8W贴片电阻-无丝印)
footprint R0805_M (1/8W贴片电阻)
footprint R01005_NS (1/32W贴片电阻-无丝印)
footprint R1206_M (1/4W贴片电阻)
footprint R1210_M (1/3W贴片电阻)
footprint R1206_NS (1/4W贴片电阻-无丝印)
footprint R1210_NS (1/3W贴片电阻)
footprint R1812_M (1/2W贴片电阻)
footprint R2010_M (3/4W贴片电阻)
footprint R2512_M (1W贴片电阻)
pins: 1, 2

## R_30
designator R?, comment 6.8K/1%
1% R0201; BOM名称: 贴片电阻
footprint R0201_M (1/20W贴片电阻)
footprint R0201_NS (1/20W贴片电阻-无丝印)
footprint R0402_M (1/16W贴片电阻)
footprint R0402_NS (1/16W贴片电阻-无丝印)
footprint R0603_M (1/10W贴片电阻)
footprint R0603_NS (1/10W贴片电阻-无丝印)
footprint R0805_NS (1/8W贴片电阻-无丝印)
footprint R0805_M (1/8W贴片电阻)
footprint R01005_NS (1/32W贴片电阻-无丝印)
footprint R1206_M (1/4W贴片电阻)
footprint R1210_M (1/3W贴片电阻)
footprint R1206_NS (1/4W贴片电阻-无丝印)
footprint R1210_NS (1/3W贴片电阻)
footprint R1812_M (1/2W贴片电阻)
footprint R2010_M (3/4W贴片电阻)
footprint R2512_M (1W贴片电阻)
pins: 1, 2